# Altium integrated library EFR_Lib.IntLib: 430 symbols (part 2 of 6) (continued)
## CON-22-WE-MPC3-66202221122 (continued)
THT Male Header WR-MPC3, Vertical, Dual Row, pitch 3 mm, 22 pins; Manufacturer P/N: 66202221122; Manufacturer: Würth Elektronik; Pitch: 3 mm; Working Voltage: 250 VAC; Contact Resistance: 10 mOhm; Pin Number: 22; ComponentLink1Description: Manufacturer; ComponentLink1URL: http://www.we-online.de; ComponentLink2Description: Datasheet; ComponentLink2URL: https://katalog.we-online.de/em/datasheet/6620xx21122.pdf; Published Date: September 2018; Operating Temperature: -40 to 105 degC; Packaging: Tube; Gender: Male; Mounting Technology: THT; Orientation: Vertical
footprint CON-22-WE-66202221122 (Dual row Vertical header 22p)
pins: 1, 2, 3, 4, 5, 6, 7, 8, 9, 10, 11, 12, 13, 14, 15, 16, 17, 18, 19, 20, 21, 22

## CON-22-WE-MPC4-649022221732
designator J?, comment MPC4 V
THT Male Header WR-MPC4, with Snap-in Plastic Pegs, Vertical, Dual Row, pitch 4.2 mm, 22 pins; Manufacturer P/N: 649022221732; Manufacturer: Würth Elektronik; Pitch: 4.2 mm; Working Voltage: 600 VAC; Contact Resistance: 10 mOhm; Pin Number: 22; ComponentLink1Description: Manufacturer; ComponentLink1URL: http://www.we-online.de; ComponentLink2Description: Datasheet; ComponentLink2URL: https://katalog.we-online.de/em/datasheet/6490xx221732.pdf; Published Date: November 2019; Operating Temperature: -40 to 105 degC; Packaging: Tray; Gender: Male; Mounting Technology: THT; Orientation: Vertical
footprint CON-22-WE-649022221732 (4.20mm Male Dual Row Vertical Header with Mounting Pegs, 22p)
pins: 1, 2, 3, 4, 5, 6, 7, 8, 9, 10, 11, 12, 13, 14, 15, 16, 17, 18, 19, 20, 21, 22

## CON-22-WE-WTB-62402221722
designator J?, comment WTB, Horiz.
WR-WTB THT Male Horizontal Shrouded Header with positive locking, Dual Row, pitch 2mm, 22p; Manufacturer: Würth Elektronik; Manufacturer P/N: 62402221722; Pin Number: 22; Contact Resistance: 20mOhm; Rated Current: 3A; Withstanding Voltage: 1000VAC; Working Voltage: 250VAC; ComponentLink1Description: Manufacturer; ComponentLink1URL: http://www.we-online.de; ComponentLink2Description: Datasheet; ComponentLink2URL: https://www.we-online.com/catalog/datasheet/62402221722.pdf; Pitch: 2mm; Published Date: January 2020; Mounting Technology: THT; Packaging: Tube; Operating Temperature: -25 to +85degC; Gender: Male; Type: Horizontal
footprint CON-22-WE-62402221722 (2.00mm Male Dual Row Horizontal Shrouded Header with positive locking, 22p)
pins: 1, 2, 3, 4, 5, 6, 7, 8, 9, 10, 11, 12, 13, 14, 15, 16, 17, 18, 19, 20, 21, 22

## CON-24-WE-MM-690367292476
designator J?, comment WR-MM+L
WR-MM MiniModule Connector, Female, SMT, Vertical, pitch 2.54mm, 24pins; Manufacturer P/N: 690367292476; Manufacturer: Würth Elektronik; PinNumber: 24; Insulation Resistance: >1000MOhm; Rated Current: 1.5A; Working Voltage: 100VAC; Withstanding Voltage: 500VAC; Contact Resistance: 10mOhm; Current (A): 1.5; Resistance: 0R010; Voltage (V): 100; ComponentLink1Description: Manufacturer; ComponentLink1URL: http://www.we-online.de; ComponentLink2Description: Datasheet; ComponentLink2URL: https://katalog.we-online.de/em/datasheet/690367292476.pdf; Published Date: June 2019; Publisher: Wurth Elektronik; Pitch: 2.54mm; Operating Temperature: -40 to +105degC; Mounting Technology: SMT; Packaging: Tape and Reel; Gender: Female; Orientation: Vertical; Power (W): *; Tolerance: *; Capacitance: *; Type: *; Value: =PartNumber
footprint CON-24-WE-690367292476 (MiniModule Connectors, PCB Type, Female, SMT, Vertical, 24p)
pins: 1, 2, 3, 4, 5, 6, 7, 8, 9, 10, 11, 12, 13, 14, 15, 16, 17, 18, 19, 20, 21, 22, 23, 24

## CON-24-WE-MPC3-66202421022
designator J?, comment MPC3 Horiz. THT
THT Male Header WR-MPC3, with Snap-in Plastic Pegs, Right Angled, Dual Row, pitch 3 mm, 24 pins; Manufacturer P/N: 66202421022; Manufacturer: Würth Elektronik; Pitch: 3 mm; Working Voltage: 250 VAC; Contact Resistance: 10 mOhm; Pin Number: 24; ComponentLink1Description: Manufacturer; ComponentLink1URL: http://www.we-online.de; ComponentLink2Description: Datasheet; ComponentLink2URL: https://katalog.we-online.de/em/datasheet/6620xx21022.pdf; Published Date: September 2018; Operating Temperature: -40 to 105 degC; Packaging: Tube; Gender: Male; Mounting Technology: THT; Orientation: Right Angled
footprint CON-24-WE-66202421022 (Dual row Right angle header With plastic peg 24p)
pins: 1, 2, 3, 4, 5, 6, 7, 8, 9, 10, 11, 12, 13, 14, 15, 16, 17, 18, 19, 20, 21, 22, 23, 24

## CON-24-WE-MPC3-66202421122
designator J?, comment MPC3 Vert. THT
THT Male Header WR-MPC3, Vertical, Dual Row, pitch 3 mm, 24 pins; Manufacturer P/N: 66202421122; Manufacturer: Würth Elektronik; Pitch: 3 mm; Working Voltage: 250 VAC; Contact Resistance: 10 mOhm; Pin Number: 24; ComponentLink1Description: Manufacturer; ComponentLink1URL: http://www.we-online.de; ComponentLink2Description: Datasheet; ComponentLink2URL: https://katalog.we-online.de/em/datasheet/6620xx21122.pdf; Published Date: September 2018; Operating Temperature: -40 to 105 degC; Packaging: Tube; Gender: Male; Mounting Technology: THT; Orientation: Vertical
footprint CON-24-WE-66202421122 (Dual row Vertical header 26p)
pins: 1, 2, 3, 4, 5, 6, 7, 8, 9, 10, 11, 12, 13, 14, 15, 16, 17, 18, 19, 20, 21, 22, 23, 24

## CON-24-WE-WTB-62402421722
designator J?, comment WR-WTB 24 H
WR-WTB THT Male Horizontal Shrouded Header with positive locking, Dual Row, pitch 2mm, 24p; Manufacturer: Würth Elektronik; Manufacturer P/N: 62402421722; Pin Number: 24; Contact Resistance: 20mOhm; Rated Current: 3A; Withstanding Voltage: 1000VAC; Working Voltage: 250VAC; ComponentLink1Description: Manufacturer; ComponentLink1URL: http://www.we-online.de; ComponentLink2Description: Datasheet; ComponentLink2URL: https://www.we-online.com/catalog/datasheet/62402421722.pdf; Pitch: 2mm; Published Date: January 2020; Mounting Technology: THT; Packaging: Tube; Operating Temperature: -25 to +85degC; Gender: Male; Orientation: Horizontal; Parameter 1: *
footprint CON-24-WE-62402421722 (2.00mm Male Dual Row Horizontal Shrouded Header with positive locking, 24p)
pins: 1, 2, 3, 4, 5, 6, 7, 8, 9, 10, 11, 12, 13, 14, 15, 16, 17, 18, 19, 20, 21, 22, 23, 24

## CON-26-WE-MM-690367292676
designator J?, comment WR-MM+L
WR-MM MiniModule Connector, Female, SMT, Vertical, pitch 2.54mm, 26pins; Manufacturer P/N: 690367292676; Manufacturer: Würth Elektronik; PinNumber: 26; Insulation Resistance: >1000MOhm; Rated Current: 1.5A; Working Voltage: 100VAC; Withstanding Voltage: 500VAC; Contact Resistance: 10mOhm; Voltage (V): 100; Current (A): 1.5; Resistance: 0R010; ComponentLink1Description: Manufacturer; ComponentLink1URL: http://www.we-online.de; ComponentLink2Description: Datasheet; ComponentLink2URL: https://katalog.we-online.de/em/datasheet/690367292676.pdf; Published Date: June 2019; Publisher: Wurth Elektronik; Pitch: 2.54mm; Operating Temperature: -40 to +105degC; Mounting Technology: SMT; Packaging: Tape and Reel; Gender: Female; Orientation: Vertical; Tolerance: *; Power (W): *; Capacitance: *; Type: *; Value: =PartNumber
footprint CON-26-WE-690367292676 (MiniModule Connectors, PCB Type, Female, SMT, Vertical, 26p)
pins: 1, 2, 3, 4, 5, 6, 7, 8, 9, 10, 11, 12, 13, 14, 15, 16, 17, 18, 19, 20, 21, 22, 23, 24, 25, 26

## CON-26-WE-WTB-62402621722
designator J?, comment WR-WTB H
WR-WTB THT Male Horizontal Shrouded Header with positive locking, Dual Row, pitch 2mm, 26p; Manufacturer: Würth Elektronik; Manufacturer P/N: 62402621722; Pin Number: 26; Contact Resistance: 20mOhm; Rated Current: 3A; Withstanding Voltage: 1000VAC; Working Voltage: 250VAC; ComponentLink1Description: Manufacturer; ComponentLink1URL: http://www.we-online.de; ComponentLink2Description: Datasheet; ComponentLink2URL: https://www.we-online.com/catalog/datasheet/62402621722.pdf; Pitch: 2mm; Published Date: January 2020; Mounting Technology: THT; Packaging: Tube; Operating Temperature: -25 to +85degC; Gender: Male; Orientation: Horizontal
footprint CON-26-WE-62402621722 (2.00mm Male Dual Row Horizontal Shrouded Header with positive locking, 26p)
pins: 1, 2, 3, 4, 5, 6, 7, 8, 9, 10, 11, 12, 13, 14, 15, 16, 17, 18, 19, 20, 21, 22, 23, 24, 25, 26

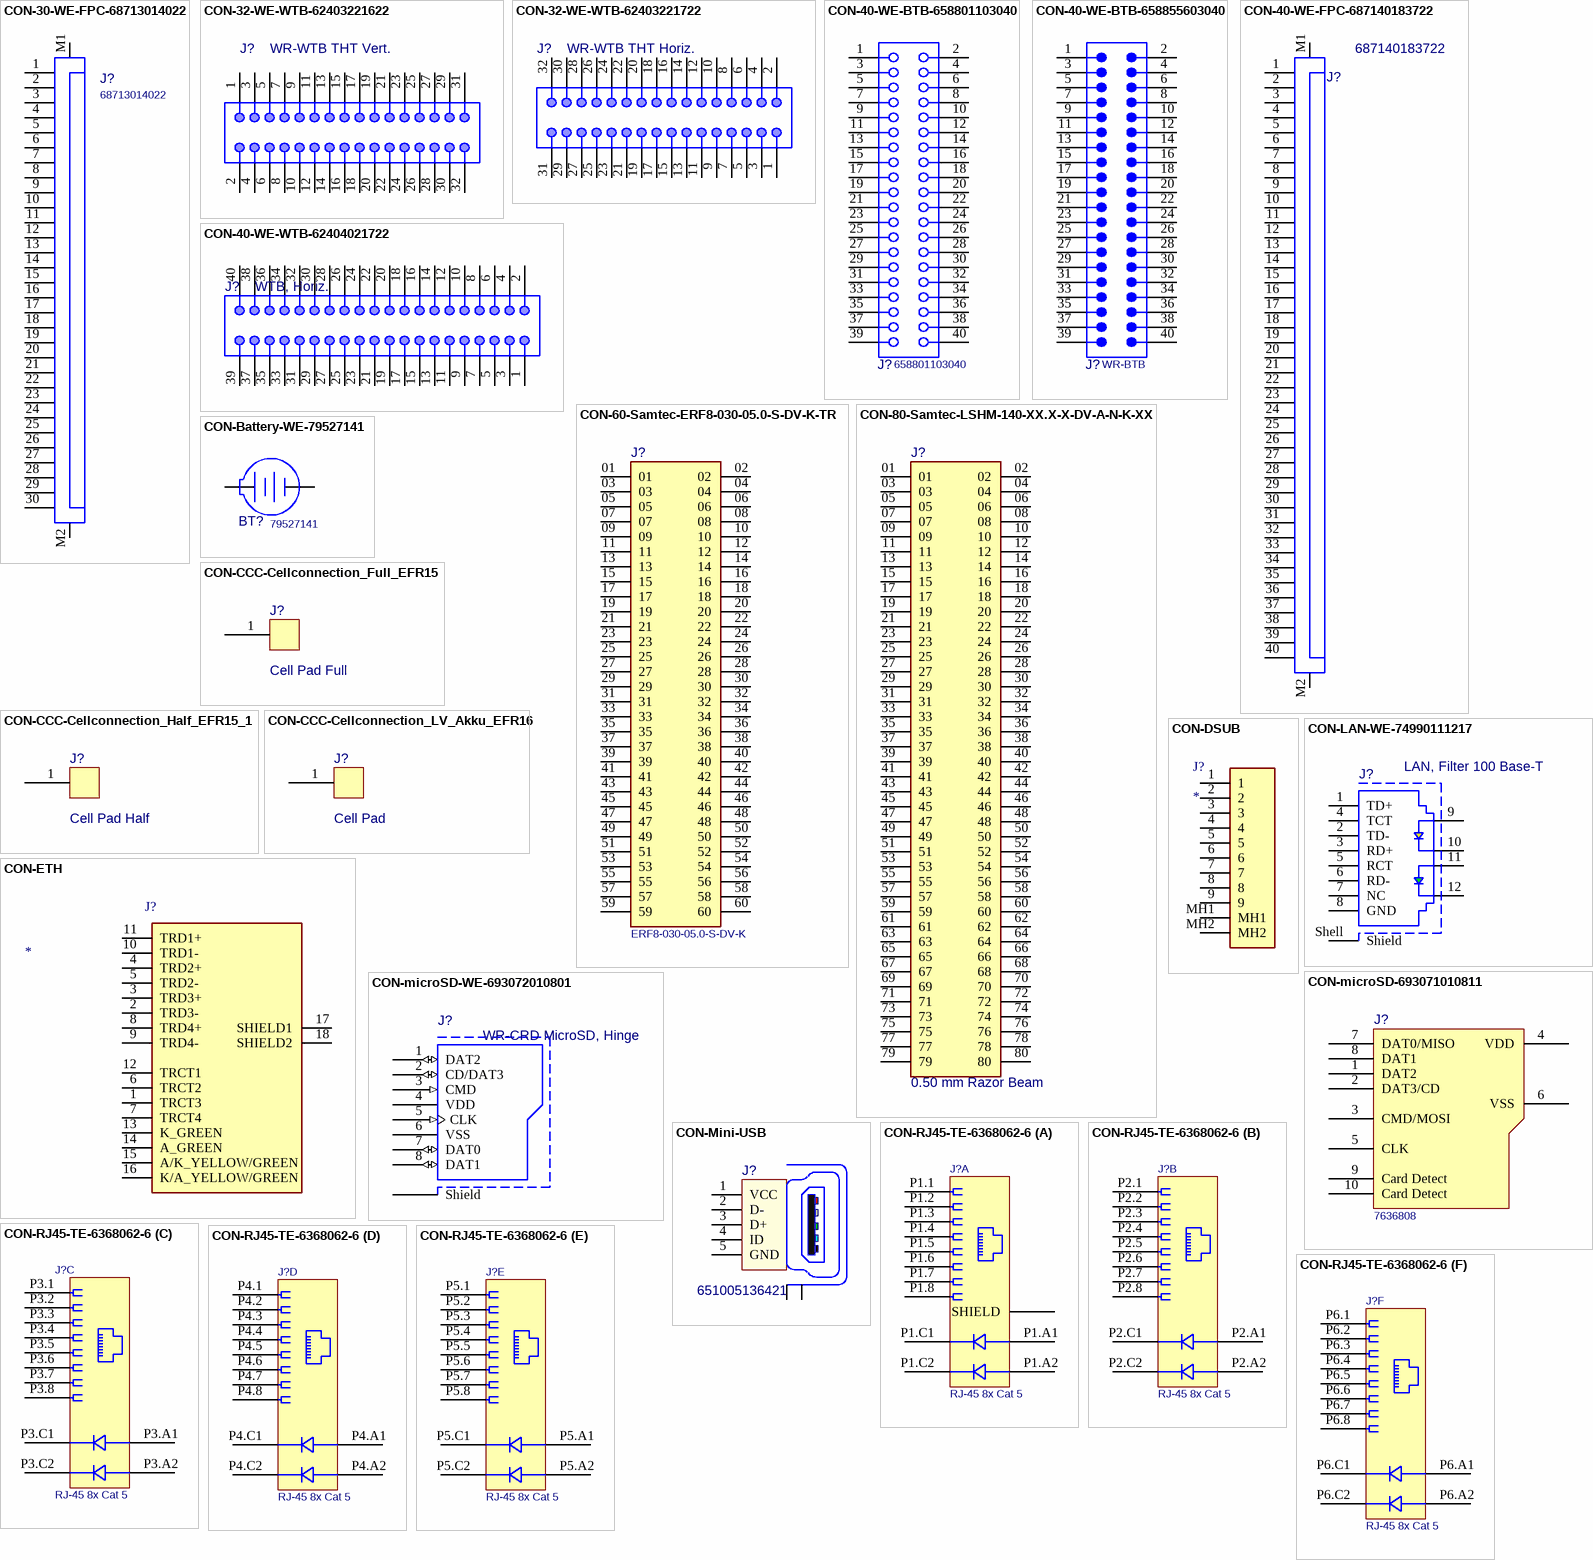
[diagram p6: symbols CON-30-WE-FPC-68713014022 to CON-RJ45-TE-6368062-6]

## CON-30-WE-FPC-68713014022
designator J?, comment 68713014022
WR-FPC SMT ZIF Horizontal Top Contact, pitch 0.5mm, Horizontal, 30pins; Manufacturer: Würth Elektronik; Op. Temperature Max (°C): 85; Op. Temperature Min (°C): -25; Contact Resistance: 20mΩ; Pin Number: 30; Rated Current: 0.5A; Voltage (V): 50; ComponentLink1Description: Website Link; ComponentLink1URL: https://www.we-online.com/redexpert/article/68713014022?ad; ComponentLink2Description: Datasheet Link; ComponentLink2URL: https://www.we-online.com/redexpert/spec/68713014022?ad; Manufacturer P/N: 68713014022; Category: FPC Connectors; Match Code: WR-FPC; Mounting Technology: SMT; Packaging: Tape and Reel; Length (mm): 21.4; Width (mm): 5.1; Height (mm): 2.1; Orientation: Horizontal; Pitch: 0.5mm
footprint CON-WE-68713014022 (ZIF Connectors, Horizontal, Top Contact, pitch 0.5mm, 30p)
pins: 1, 2, 3, 4, 5, 6, 7, 8, 9, 10, 11, 12, 13, 14, 15, 16, 17, 18, 19, 20, 21, 22, 23, 24, 25, 26, 27, 28, 29, 30, M1, M2

## CON-32-WE-WTB-62403221622
designator J?, comment WR-WTB THT Vert.
WR-WTB THT Male Vertical Shrouded Header with positive locking, Dual Row, pitch 2mm, 32p; Manufacturer: Würth Elektronik; Manufacturer P/N: 62403221622; Pin Number: 32; Contact Resistance: 20mOhm; Rated Current: 3A; Withstanding Voltage: 1000VAC; Working Voltage: 250VAC; ComponentLink1Description: Manufacturer; ComponentLink1URL: https://www.we-online.com/catalog/en/WTB_2_00_MALE_DUAL_ROW_VERTICAL_SHROUDED_HEADER_W_POSITIVE_LOCKING_6240XX21622#62403221622; ComponentLink2Description: Datasheet; ComponentLink2URL: https://www.we-online.com/catalog/datasheet/62403221622.pdf; Pitch: 2mm; Published Date: January 2020; Mounting Technology: THT; Packaging: Tube; Operating Temperature: -25 to +85degC; Gender: Male; Type: Vertical
footprint CON-32-WE-62403221622 (2.00mm Male Dual Row Vertical Shrouded Header with positive locking, 32p)
pins: 1, 2, 3, 4, 5, 6, 7, 8, 9, 10, 11, 12, 13, 14, 15, 16, 17, 18, 19, 20, 21, 22, 23, 24, 25, 26, 27, 28, 29, 30, 31, 32

## CON-32-WE-WTB-62403221722
designator J?, comment WR-WTB THT Horiz.
WR-WTB THT Male Horizontal Shrouded Header with positive locking, Dual Row, pitch 2mm, 32p; Manufacturer: Würth Elektronik; Manufacturer P/N: 62403221722; Pin Number: 32; Contact Resistance: 20mOhm; Rated Current: 3A; Withstanding Voltage: 1000VAC; Working Voltage: 250VAC; ComponentLink1Description: Manufacturer; ComponentLink1URL: https://www.we-online.com/catalog/en/WTB_2_00_MALE_DUAL_ROW_HORIZONTAL_SHROUDED_HEADER_W_POSITIVE_LOCKING_6240XX21722#62403221722; ComponentLink2Description: Datasheet; ComponentLink2URL: https://www.we-online.com/catalog/datasheet/62403221722.pdf; Pitch: 2mm; Published Date: January 2020; Mounting Technology: THT; Packaging: Tube; Operating Temperature: -25 to +85degC; Gender: Male; Type: Horizontal
footprint CON-32-WE-62403221722 (2.00mm Male Dual Row Horizontal Shrouded Header with positive locking, 32p)
pins: 1, 2, 3, 4, 5, 6, 7, 8, 9, 10, 11, 12, 13, 14, 15, 16, 17, 18, 19, 20, 21, 22, 23, 24, 25, 26, 27, 28, 29, 30, 31, 32

## CON-40-WE-BTB-658801103040
designator J?, comment 658801103040
WR-BTB Board to Board Connector, Female Receptacle, pitch 0.8mm, height 11.75mm, 40p; Manufacturer: Würth Elektronik; Compliance: Lead free / RoHS; Contact Resistance: 50mΩ; Insulation Resistance: 100MΩ; Rated Current: 0.5A; Working Voltage: 50VAC; Withstanding Voltage: 500VAC; ComponentLink1Description: Website Link; ComponentLink1URL: https://www.we-online.com/redexpert/article/658801103040?ad; ComponentLink2Description: Datasheet Link; ComponentLink2URL: https://www.we-online.com/redexpert/spec/658801103040?ad; Manufacturer P/N: 658801103040; Category: Board-to-Board Connectors; Match Code: WR-BTB; Mounting Technology: SMT; Operating Temperature Max: 85°C; Operating Temperature Min: -55°C; Packaging: Tape and Reel; Height: 11.75mm; Gender: Female Receptacle; Number of Pins: 40; Orientation: Vertical; Pitch: 0.8mm
footprint 658801103040
pins: 1, 2, 3, 4, 5, 6, 7, 8, 9, 10, 11, 12, 13, 14, 15, 16, 17, 18, 19, 20, 21, 22, 23, 24, 25, 26, 27, 28, 29, 30, 31, 32, 33, 34, 35, 36, 37, 38, 39, 40

## CON-40-WE-BTB-658855603040
designator J?, comment WR-BTB
WR-BTB Board to Board Connector, Male Plug, pitch 0.8mm, height 5.6mm, 40p; Manufacturer P/N: 658855603040; Manufacturer: Würth Elektronik; Compliance: Lead free / RoHS; Contact Resistance: 50mΩ; Insulation Resistance: 100MΩ; Rated Current: 0.5A; Working Voltage: 50VAC; Withstanding Voltage: 500VAC; ComponentLink1Description: Website Link; ComponentLink1URL: https://www.we-online.com/redexpert/article/658855603040?ad; ComponentLink2Description: Datasheet Link; ComponentLink2URL: https://www.we-online.com/redexpert/spec/658855603040?ad; Category: Board-to-Board Connectors; Match Code: WR-BTB; Mount: SMT; Operating Temperature Max: 85°C; Operating Temperature Min: -55°C; Packaging: Tape and Reel; Height: 5.6mm; Gender: Male Plug; Number of Pins: 40; Orientation: Vertical; Pitch: 0.8mm
footprint 658855603040
pins: 1, 2, 3, 4, 5, 6, 7, 8, 9, 10, 11, 12, 13, 14, 15, 16, 17, 18, 19, 20, 21, 22, 23, 24, 25, 26, 27, 28, 29, 30, 31, 32, 33, 34, 35, 36, 37, 38, 39, 40

## CON-40-WE-FPC-687140183722
designator J?, comment 687140183722
WR-FPC SMT ZIF Horizontal Bottom Contact Low Profile, pitch 0.5mm, Horizontal, 40pins; Manufacturer: Würth Elektronik; Contact Resistance: 30mΩ; Rated Current: 0.4A; Working Voltage: 50VAC; ComponentLink1Description: Website Link; ComponentLink1URL: https://www.we-online.com/redexpert/article/687140183722?ad; ComponentLink2Description: Datasheet Link; ComponentLink2URL: https://www.we-online.com/redexpert/spec/687140183722?ad; Manufacturer P/N: 687140183722; Category: FPC Connectors; Match Code: WR-FPC; Mounting Technology: SMT; Operating Temperature Max: 85°C; Operating Temperature Min: -25°C; Packaging: Tape and Reel; Length: 25.7mm; Width: 4.25mm; Height: 1.2mm; Number of Pins: 40; Orientation: Horizontal; Pitch: 0.5mm
footprint CON-40-WE-687140183722 (ZIF Connectors, Horizontal, Bottom Contact Low Profile, pitch 0.5mm, 40p)
pins: 1, 2, 3, 4, 5, 6, 7, 8, 9, 10, 11, 12, 13, 14, 15, 16, 17, 18, 19, 20, 21, 22, 23, 24, 25, 26, 27, 28, 29, 30, 31, 32, 33, 34, 35, 36, 37, 38, 39, 40, M1, M2

## CON-40-WE-WTB-62404021722
designator J?, comment WTB, Horiz.
WR-WTB THT Male Horizontal Shrouded Header with positive locking, Dual Row, pitch 2mm, 40p; Manufacturer: Würth Elektronik; Manufacturer P/N: 62404021722; Pin Number: 40; Contact Resistance: 20mOhm; Rated Current: 3A; Withstanding Voltage: 1000VAC; Working Voltage: 250VAC; ComponentLink1Description: Manufacturer; ComponentLink1URL: http://www.we-online.de; ComponentLink2Description: Datasheet; ComponentLink2URL: https://www.we-online.com/catalog/datasheet/62404021722.pdf; Pitch: 2mm; Published Date: January 2020; Mounting Technology: THT; Packaging: Tube; Operating Temperature: -25 to +85degC; Gender: Male; Orientation: Horizontal
footprint CON-40-WE-62404021722 (2.00mm Male Dual Row Horizontal Shrouded Header with positive locking, 40p)
pins: 1, 2, 3, 4, 5, 6, 7, 8, 9, 10, 11, 12, 13, 14, 15, 16, 17, 18, 19, 20, 21, 22, 23, 24, 25, 26, 27, 28, 29, 30, 31, 32, 33, 34, 35, 36, 37, 38, 39, 40

## CON-60-Samtec-ERF8-030-05.0-S-DV-K-TR
designator J?, comment ERF8-030-05.0-S-DV-K
Samtec Edge Rate® ERF8-Series Rugged High Speed Socket 0.80mm; Manufacturer P/N: ERF8-030-05.0-S-DV-K-TR; Package: Custom; Manufacturer: Samtec; Mounting Technology: SMT; Supplier 1: Mouser; Supplier Part Number 1: 200-ERF8030050SDVKTR; Supplier 2: Digikey; Supplier Part Number 2: SAM8620CT-ND
footprint CON-60-SAMTEC_ERF8-030-05.0-S-DV-K-TR (Footprint not found)
pins: 01, 02, 03, 04, 05, 06, 07, 08, 09, 10, 11, 12, 13, 14, 15, 16, 17, 18, 19, 20, 21, 22, 23, 24, 25, 26, 27, 28, 29, 30, 31, 32, 33, 34, 35, 36, 37, 38, 39, 40, 41, 42, 43, 44, 45, 46, 47, 48, 49, 50, 51, 52, 53, 54, 55, 56, 57, 58, 59, 60

## CON-80-Samtec-LSHM-140-XX.X-X-DV-A-N-K-XX
designator J?, comment 0.50 mm Razor Beam
LSHM - Samtec 0.50mm Razor Beam High-Speed Hermaphroditic Terminal / Socket Strip; Manufacturer P/N: LSHM-140-06.0-L-DV-A-N-K-TR; Manufacturer: Samtec; Check_prices: https://www.snapeda.com/parts/LSHM-140-06.0-L-DV-A-N-K-TR/Samtec/view-part/3558786/?ref=eda; SnapEDA_Link: https://www.snapeda.com/parts/LSHM-140-06.0-L-DV-A-N-K-TR/Samtec/view-part/3558786/?ref=snap; Price: None; Package: None; Availability: In Stock; Value: *; Purchase-URL: https://pricing.snapeda.com/search/part/LSHM-140-06.0-L-DV-A-N-K-TR/?ref=eda; Mounting Technology: SMT
footprint SAMTEC_LSHM-140-XX.X-X-DV-A-N-K-XX
pins: 01, 02, 03, 04, 05, 06, 07, 08, 09, 10, 11, 12, 13, 14, 15, 16, 17, 18, 19, 20, 21, 22, 23, 24, 25, 26, 27, 28, 29, 30, 31, 32, 33, 34, 35, 36, 37, 38, 39, 40, 41, 42, 43, 44, 45, 46, 47, 48, 49, 50, 51, 52, 53, 54, 55, 56, 57, 58, 59, 60, 61, 62, 63, 64, 65, 66, 67, 68, 69, 70, 71, 72, 73, 74, 75, 76, 77, 78, 79, 80

## CON-Battery-WE-79527141
designator BT?, comment 79527141
WA-BCPH Battery Holder, SMT, battery type 2032; Manufacturer: Würth Elektronik; Battery Type: 2032; ComponentLink1Description: Website Link; ComponentLink1URL: https://www.we-online.com/redexpert/article/79527141?ad; ComponentLink2Description: Datasheet Link; ComponentLink2URL: https://www.we-online.com/redexpert/spec/79527141?ad; Manufacturer P/N: 79527141; Category: Battery Holders; Match Code: WA-BCPH; Mounting Technology: SMT; Operating Temperature Max: 105°C; Operating Temperature Min: -40°C; Packaging: Tape and Reel
footprint 79527141
pins: 1 +, 2 -

## CON-CCC-Cellconnection_Full_EFR15
designator J?, comment Cell Pad Full  (no BOM)
Cell Connection Pad Full for 4 Cells on CCC EFR15; Manufacturer: Elbflorace e.V.; PinNumber: 2; Manufacturer P/N: *
footprint CON-CCC-Cellconnection_Full_EFR15
pins: 1

## CON-CCC-Cellconnection_Half_EFR15_1
designator J?, comment Cell Pad Half  (no BOM)
Cell Connection Pad Half for 2 Cells on CCC EFR15; Manufacturer: Elbflorace e.V.; PinNumber: 2; Manufacturer P/N: *
footprint CON-CCC-Cellconnection_Half_EFR15
pins: 1

## CON-CCC-Cellconnection_LV_Akku_EFR16
designator J?, comment Cell Pad  (no BOM)
Cell Connection Pad on LVCSC EFR16; Manufacturer: Elbflorace e.V.; PinNumber: 2; Manufacturer P/N: *
footprint CON-CCC-Cellconnection_Full_LV_Akku_EFR16
footprint CON-CCC-Cellconnection_Half_LV_Akku_EFR16
footprint CON-CCC-Cellconnection_Thin_LV_Akku_EFR16
pins: 1

## CON-DSUB
designator J?
2301843-1; Manufacturer: TE Connectivity; Datasheet Link: https://componentsearchengine.com/Datasheets/2/2301843-1.pdf; Height: 13.955mm; Manufacturer P/N: 2301843-1; Mouser Part Number: 571-2301843-1; Mouser Price/Stock: https://www.mouser.com/Search/Refine.aspx?Keyword=571-2301843-1; Mounting Technology: THT
footprint CON-DSUB
pins: 1, 2, 3, 4, 5, 6, 7, 8, 9, MH1, MH2

## CON-ETH
designator J?
0826-1K1T-43-F / Connector for Ethernet with Shield and 2 LEDs; Manufacturer: Bel; Datasheet Link: https://belfuse.com/resources/drawings/magneticsolutions/dr-mag-0826-1k1t-43-f.pdf; Height: 13.61mm; Manufacturer P/N: 0826-1K1T-43-F; Mouser Part Number: 530-0826-1K1T-43-F; Mounting Technology: THT
footprint 08261K1T43F
pins: 1 TRCT3, 2 TRD3-, 3 TRD3+, 4 TRD2+, 5 TRD2-, 6 TRCT2, 7 TRCT4, 8 TRD4+, 9 TRD4-, 10 TRD1-, 11 TRD1+, 12 TRCT1, 13 K_GREEN, 14 A_GREEN, 15 A/K_YELLOW/GREEN, 16 K/A_YELLOW/GREEN, 17 SHIELD1, 18 SHIELD2

## CON-LAN-WE-74990111217
designator J?, comment LAN, Filter 100 Base-T
WE-RJ45 LAN Transformer, THT, 10/100 Base-T, Port 1x1, Tab Up; Manufacturer P/N: 74990111217; Manufacturer: Würth Elektronik; PoE: non-PoE; LED: yellow-green; USB: No; Shield Tabs: Yes; ComponentLink1Description: Manufacturer; ComponentLink1URL: http://www.we-online.de; ComponentLink2Description: Datasheet; ComponentLink2URL: https://www.we-online.com/catalog/datasheet/74990111217.pdf; Published Date: October 2020; Tab: Up; Port Number: 1x1; Data Rate: 10/100 Base-T; Operating Temperature: -40 to +85degC; Mounting Technology: THT; Packaging: Tube; HPLE: No
footprint CON-LAN-WE-74990111217 (LAN Transformer, body 21.3x16mm)
pins: 1 TD+, 2 TD-, 3 RD+, 4 TCT, 5 RCT, 6 RD-, 7 NC, 8 GND, 9, 10, 11, 12, Shell Shield

## CON-microSD-693071010811
designator J?, comment Supplier Part Number 1: 7636808  (hidden comment: 693071010811)
WR-CRD Micro SD Card Connector, Push & Push, with card detection; Manufacturer: Würth Elektronik; Contact Resistance: 100mΩ; Gender: Socket; Rated Current: 0.5A; Working Voltage: 100VAC; Withstanding Voltage: 500VAC; Number of Contacts: 8; ComponentLink1Description: Website Link; ComponentLink1URL: https://www.we-online.com/redexpert/article/693071010811?ad; ComponentLink2Description: Datasheet Link; ComponentLink2URL: https://www.we-online.com/redexpert/spec/693071010811?ad; Category: Input/Output Connectors; Match Code: WR-CRD; Mounting Technology: SMT; Operating Temperature Max: 85°C; Operating Temperature Min: -25°C; Packaging: Tape and Reel; Number of Pins: 8; Type: Push & Push; Supplier 1: RSComponents; Supplier 2: Mouser; Manufacturer P/N: 693071010811; RoHS: Yes; Stock 2: 32325; Pricing 2: 1=3,11000, 10=3,04000, 50=2,68000, 100=2,56000, 500=2,19000, 1000=2,19000, 1400=2,01000, 10000=2,01000 (USD); Contact Material: Copper Alloy,Copper,Gold; Contact Plating: Gold; Min Operating Temperature: -25°C; Max Operating Temperature: 85°C; Package Quantity: 1; Connector Type: Connector; Series: -; Length: 14mm; Width: 15.2mm; Height: 1.98mm; REACH SVHC: Unknown; RoHS Compliant: Yes; Lead Free: Lead Free; Supplier Part Number 2: 710-693071010811
footprint CON-WE-693071010811 (Micro SD Card Connector Push & Push - with Card Detection - 8 Pins)
pins: 1 DAT2, 2 DAT3/CD, 3 CMD/MOSI, 4 VDD, 5 CLK, 6 VSS, 7 DAT0/MISO, 8 DAT1, 9 Card Detect, 10 Card Detect

## CON-microSD-WE-693072010801
designator J?, comment WR-CRD MicroSD, Hinge
WR-CRD Micro SD Card Connector Hinge Type; Manufacturer: Würth Elektronik; Manufacturer P/N: 693072010801; Contact Resistance: 100mOhm; Gender: Socket; Pin Number: 8; Working Voltage: 100VAC; Withstanding Voltage: 500VAC; Rated Current: 0.5A; ComponentLink1Description: Manufacturer; ComponentLink1URL: https://www.we-online.com/katalog/en/CRD_SD_MICRO_HINGEL_8_PINS#693072010801; ComponentLink2Description: Datasheet; ComponentLink2URL: https://katalog.we-online.com/em/datasheet/693072010801.pdf; Packaging: Tape and Reel; Published Date: November 2019; Mounting Technology: SMT; Operating Temperature: -25 to +85degC; Type: Hinge
footprint WE-microSD-693072010801 (Micro SD Card Connector Hinge - 8 Pins)
pins: 1 DAT2 (io), 2 CD/DAT3 (io), 3 CMD (in), 4 VDD (power), 5 CLK (in), 6 VSS (power), 7 DAT0 (io), 8 DAT1 (io), Shield

## CON-Mini-USB
designator J?, comment 651005136421
WR-COM Mini USB Vertical TH Type B 5 Contacts; Manufacturer: Würth Elektronik eiSos GmbH; ComponentLink1 Description: Manufacturer; ComponentLink2 Description: Datasheet; NoPins: 5; ComponentLink1URL: http://www.we-online.de; ComponentLink2URL: http://katalog.we-online.de/em/datasheet/651005136421.pdf; Created by: Karrer Zheng; Created Date: 10/10/2014; Manufacturer P/N: 651005136421; ComponentLink1Description: Hersteller; ComponentLink1URL: https://www.we-online.de/katalog/de/COM_MINI_TYPE_B_VERTICAL/; ComponentLink2Description: Datenblatt; ComponentLink2URL: https://www.we-online.de/katalog/datasheet/651005136421.pdf; Mounting Technology: THT
footprint CON-MiniUSB-651005136421 (Mini USB 2.0 Type B Vertical 5 Contacts)
pins: 1 VCC, 2 D-, 3 D+, 4 ID, 5 GND, Shell, Shell

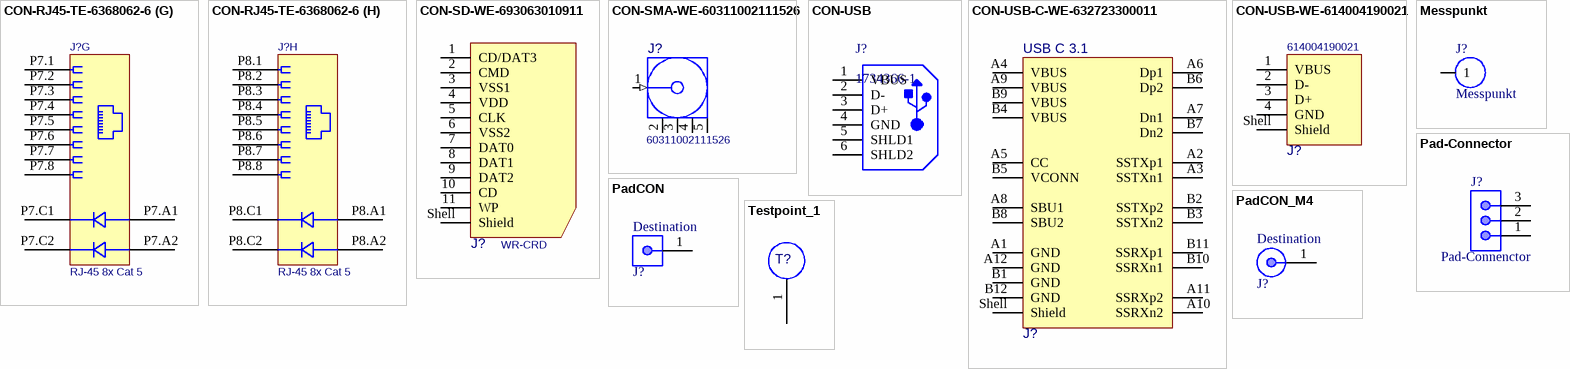
[diagram p7: symbols CON-RJ45-TE-6368062-6 to Testpoint_1]
